# Altium footprint library PcbLib_jp.PcbLib: 255 footprints (part 3 of 16)
Each footprint in its own frame and in the unit in brackets; x right, y up, seen from the top. Pads: shape width x height; smd on the part's side, far side on the other; paste and mask are expansions set on the pad; w line width, h text height; cw(c..) or ccw(c..) is an arc to the next point about the centre after c.
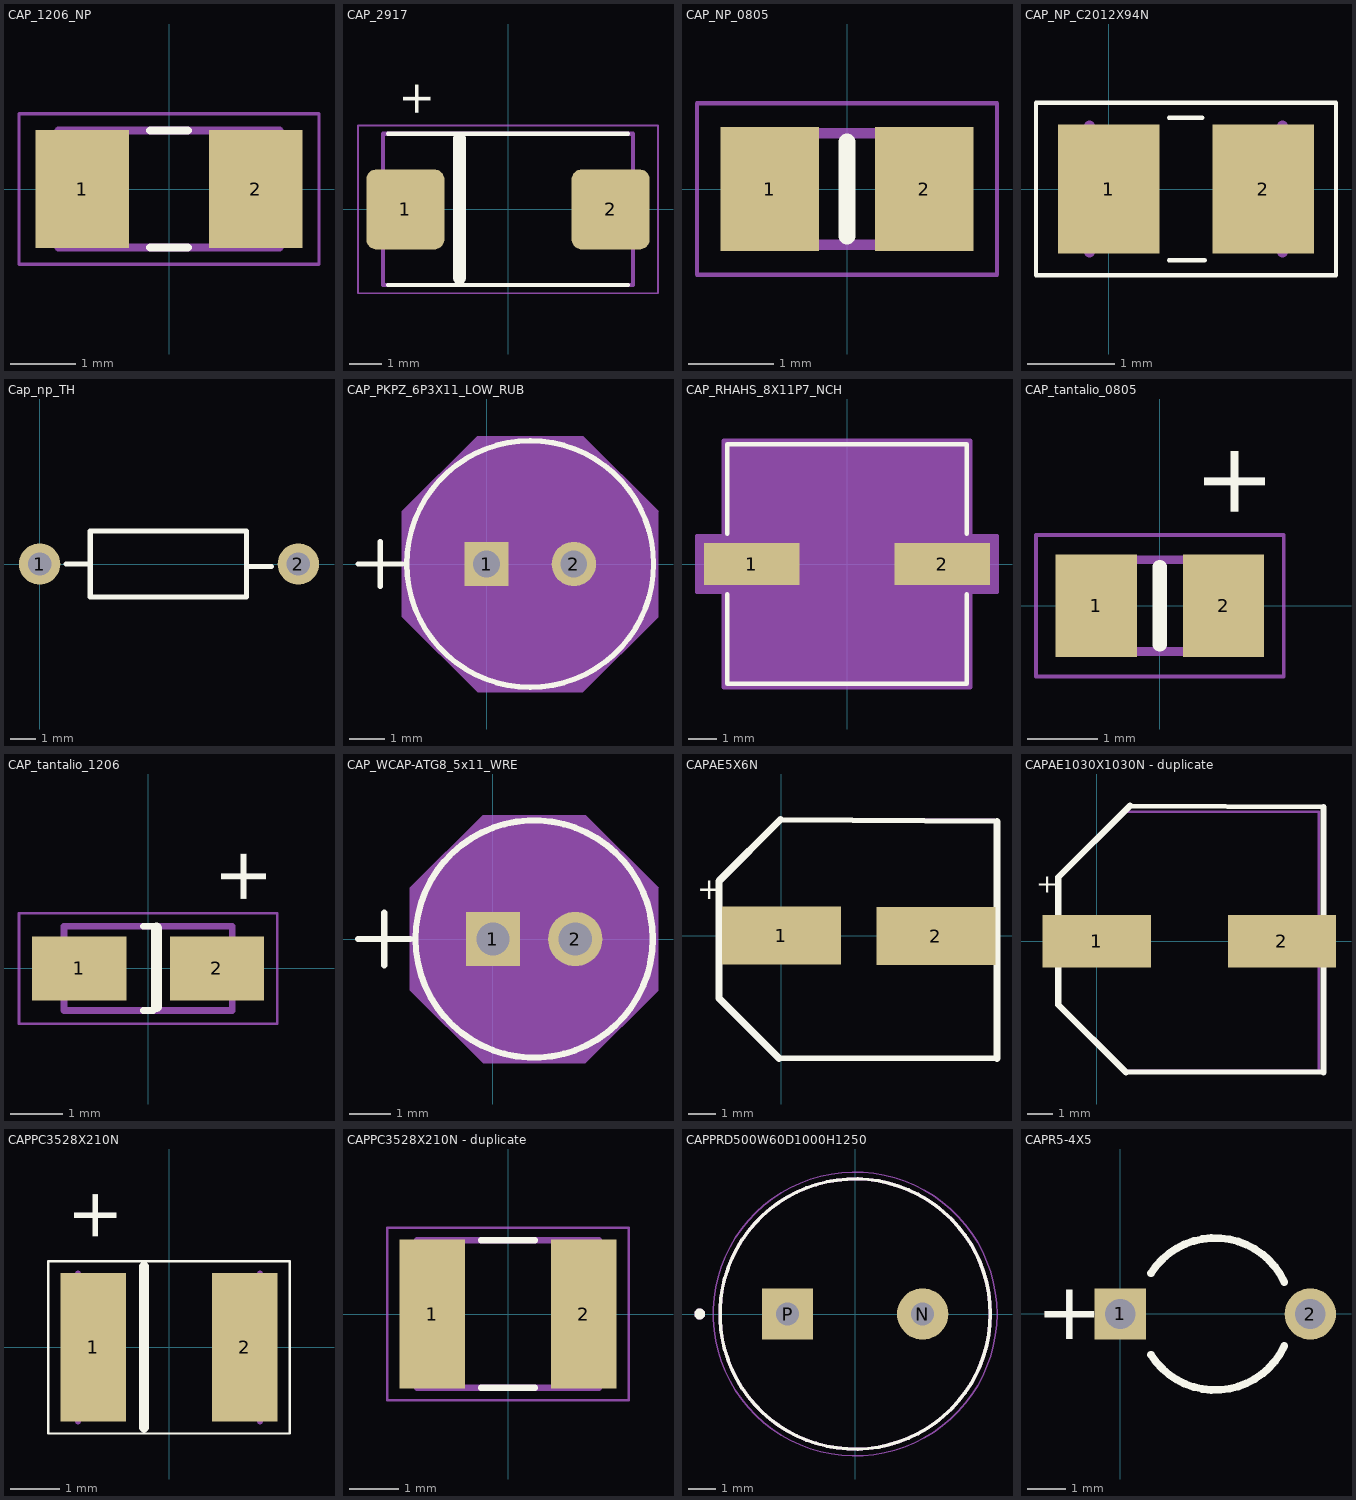
[diagram p2: the footprints below, top view; thin cyan lines are the x and y axes]

## CAP_1206_NP [mm]
pads (2):
  rect 1.44x1.82 smd: 1(-1.336,0) 2(1.336,0)
Top Overlay:
  lines w0.127: -0.29,-0.9 0.29,-0.9 ; -0.29,0.9 0.29,0.9
Mechanical 13:
  lines w0.127: -1.7,-0.9 -1.7,0.9 1.7,0.9 1.7,-0.9 -1.7,-0.9
Mechanical 15:
  lines w0.05: -2.308,-1.158 -2.308,1.158 2.308,1.158 2.308,-1.158 -2.308,-1.158
3D body "User Library-Vhip cap 1206.STEP": height 1.85, standoff 0.15, extent -1.66,-0.87 1.54,0.87

## CAP_2917 [mm]
pads (2):
  rrect25% 2.37x2.43 smd: 1(-3.12,0) 2(3.12,0)
Top Overlay:
  lines w0.127: -3.65,-2.3 3.65,-2.3 ; -3.65,2.3 3.65,2.3
  lines w0.4: -1.47,-2.09 -1.47,2.16
  text "+" at -2.35,2.79 h1
Mechanical 13:
  lines w0.127: -3.8,-2.3 -3.8,2.3 3.8,2.3 3.8,-2.3 -3.8,-2.3
Mechanical 15:
  lines w0.05: -4.56,-2.55 4.56,-2.55 4.56,2.55 -4.56,2.55 -4.56,-2.55
3D body "User Library-AVX_D_CASE.STEP": height 3.01, standoff 0, extent -3.71,-2.285 3.69,2.165

## CAP_NP_0805 [mm]
pads (2):
  rect 1.15x1.45 smd: 1(-0.9,0) 2(0.9,0)
Top Overlay:
  lines w0.2: 0,-0.55 0,0.55
Mechanical 13:
  region: 1,-0.65 0.5,-0.65 0.5,0.65 1,0.65
  region: -0.5,-0.65 -1,-0.65 -1,0.65 -0.5,0.65
  lines w0.127: -1,-0.65 -1,0.65 1,0.65 1,-0.65 -1,-0.65
Mechanical 15:
  lines w0.05: -1.75,-1 -1.75,1 1.75,1 1.75,-1 -1.75,-1
3D body "08055C104MAT2A.step": height 1.04, standoff 0.1, extent -1.045,-0.625 0.965,0.625

## CAP_NP_C2012X94N [mm]
pads (2):
  rect 1.16x1.47 smd: 1(0,0) 2(1.76,0)
Top Overlay:
  lines w0.05: 0.686,-0.813 1.092,-0.813 ; 0.686,0.813 1.067,0.813 ; -0.833,-0.983 2.593,-0.983 2.593,0.983 -0.833,0.983 -0.833,-0.983
Mechanical 13:
  lines w0.127: -0.22,-0.72 -0.22,0.72 -0.22,-0.72 ; 1.98,-0.72 1.98,0.72 1.98,-0.72
3D body "User Library-CapCeramic_Kemet_0603_1608.STEP": height 0.8, standoff 0, extent 0.055,-0.4 1.655,0.4

## Cap_np_TH [mm] "Axial Device, Thru-Hole; 2 Leads; 0.5 in Pin Spacing"
height 2.54
pads (2):
  round 1.6 hole 0.9: 1(0,0) 2(10,0)
Top Overlay:
  lines w0.2: 1.016,0 1.956,0 ; 8.052,-0.102 8.966,-0.102 ; 1.956,-1.27 7.722,-1.27 8.001,-1.27 8.001,1.27 1.956,1.27 1.956,-1.27
3D body "User Library-PB-5R0H104-R.STEP": height 4, standoff -11.02, extent -0.672,-2.972 10.628,3.028

## CAP_PKPZ_6P3X11_LOW_RUB [mil]
pads (2):
  rect 50x50 / inner round 60 / far side round 50 hole 30 paste-25 mask+0: 1(0,0)
  round 50 / inner round 60 / far side round 50 hole 30 paste-25 mask+0: 2(98.43,0)
Top Overlay:
  circle w6: c49.21,0 r139
  lines w6: -144.79,0 -94.79,0 ; -119.79,-25 -119.79,25
Mechanical 13:
  circle w0: c49.21,0 r134
  lines w1: -144.79,0 -94.79,0 ; -119.79,-25 -119.79,25
Mechanical 15:
  region: -94.79,59.29 -10.08,144 108.51,144 193.21,59.29 193.21,-59.29 108.51,-144 -10.08,-144 -94.79,-59.29
  lines w1: -94.79,-59.29 -94.79,59.29 -10.08,144 108.51,144 193.21,59.29 193.21,-59.29 108.51,-144 -10.08,-144 -94.79,-59.29
3D body "CAP_PKPZ_6P3X11_LOW_RUB.step": height 492.6, standoff -160, extent -84.8,-134 184.32,134

## CAP_RHAHS_8X11P7_NCH [mil]
pads (2):
  rect 134x59 smd paste+0 mask+0: 1(-134,0) 2(134,0)
Top Overlay:
  lines w6: -168.5,-42.6 -168.5,-168.5 168.5,-168.5 168.5,-42.6 ; -168.5,42.6 -168.5,168.5 168.5,168.5 168.5,42.6
Mechanical 13:
  lines w1: -163.5,-81.75 -81.75,-163.5 ; -163.5,81.75 -81.75,163.5 ; -163.5,-163.5 -163.5,163.5 163.5,163.5 163.5,-163.5 -163.5,-163.5
Mechanical 15:
  region: -173.5,-39.5 -211,-39.5 -211,39.5 -173.5,39.5 -173.5,173.5 173.5,173.5 173.5,39.5 211,39.5 211,-39.5 173.5,-39.5 173.5,-173.5 -173.5,-173.5
  lines w6: -211,-39.5 -173.5,-39.5 -173.5,-173.5 173.5,-173.5 173.5,-39.5 211,-39.5 211,39.5 173.5,39.5 173.5,173.5 -173.5,173.5 -173.5,39.5 -211,39.5 -211,-39.5
3D body "CAP_RHAHS_8X11P7_NCH.step": height 474.09, standoff 0, extent -180.98,-163.5 180.98,163.5

## CAP_tantalio_0805 [mm]
pads (2):
  rect 1.15x1.45 smd: 1(-0.9,0) 2(0.9,0)
Top Overlay:
  lines w0.2: 0,-0.55 0,0.55
  text "+" at 1.49,1.18 h1
Mechanical 13:
  region: -0.5,-0.65 -1,-0.65 -1,0.65 -0.5,0.65
  region: 1,-0.65 0.5,-0.65 0.5,0.65 1,0.65
  lines w0.127: -1,-0.65 1,-0.65 1,0.65 -1,0.65 -1,-0.65
Mechanical 15:
  lines w0.05: -1.75,-1 1.75,-1 1.75,1 -1.75,1 -1.75,-1
3D body "08055C104MAT2A.step": height 1.22, standoff -0.03, extent -0.995,-0.47 1.015,0.47

## CAP_tantalio_1206 [mm]
pads (2):
  rect 1.79x1.21 smd: 1(-1.31,0) 2(1.31,0)
Top Overlay:
  lines w0.127: -0.095,-0.8 0.095,-0.8 ; -0.095,0.8 0.095,0.8
  lines w0.203: 0.16,-0.73 0.16,0.77
  text "+" at 2.25,1.17 h1
Mechanical 13:
  lines w0.127: -1.6,-0.8 1.6,-0.8 1.6,0.8 -1.6,0.8 -1.6,-0.8
Mechanical 15:
  lines w0.05: -2.455,-1.05 2.455,-1.05 2.455,1.05 -2.455,1.05 -2.455,-1.05
3D body "TPSA225M010R1800.STEP": height 1.8, standoff 0, extent -1.65,-0.81 1.55,0.79

## CAP_WCAP-ATG8_5x11_WRE [mil]
pads (2):
  rect 52x52 / inner round 60 / far side rect 52x52 hole 32 paste-26 mask+0: 1(0,0)
  round 52 / inner round 60 / far side round 52 hole 32 paste-26 mask+0: 2(78.74,0)
Top Overlay:
  circle w6: c39.37,0 r113.5
  lines w6: -129.13,0 -79.13,0 ; -104.13,-25 -104.13,25
Mechanical 13:
  circle w0: c39.37,0 r108.5
  lines w1: -129.13,0 -79.13,0 ; -104.13,-25 -104.13,25
Mechanical 15:
  region: -79.13,48.79 -9.42,118.5 88.16,118.5 157.87,48.79 157.87,-48.79 88.16,-118.5 -9.42,-118.5 -79.13,-48.79
  lines w1: -79.13,-48.79 -79.13,48.79 -9.42,118.5 88.16,118.5 157.87,48.79 157.87,-48.79 88.16,-118.5 -9.42,-118.5 -79.13,-48.79
3D body "CAP_WCAP-ATG8_5x11_WRE.step": height 482.6, standoff -165.98, extent -69.13,-108.5 149.03,108.5

## CAPAE5X6N [mm]
pads (2):
  rect 4.3x2.1 smd: 1(0,0) 2(5.588,-0.013)
Top Overlay:
  lines w0.2: -0.076,-4.432 7.795,-4.432 ; -0.036,4.193 7.795,4.135
  lines w0.254: -0.076,-4.432 -2.245,-2.264 -2.245,1.984 -0.036,4.193 ; 7.795,-4.432 7.795,4.135
  text "+" at -3.048,1.321 h0.76
Mechanical 13:
  lines w0.1: -2.245,-2.264 -2.188,1.984 ; -2.245,1.984 -0.036,4.193 7.689,4.193 ; -2.007,-2.502 -0.051,-4.432 ; -0.172,-4.432 7.795,-4.432 7.795,4.135
3D body "User Library-9D.STEP": height 6.42, standoff 0, extent -0.206,-2.476 5.794,2.823

## CAPAE1030X1030N - duplicate [mm]
pads (2):
  rect 4.3x2.1 smd: 1(0,0) 2(7.366,0)
Top Overlay:
  lines w0.2: 1.165,-5.207 9.017,-5.207 ; 1.323,5.387 9.017,5.33
  lines w0.254: 1.165,-5.207 -1.524,-2.518 -1.524,-2.413 -1.524,2.54 1.323,5.387 ; 9.017,-5.207 9.017,5.33
  text "+" at -2.413,1.93 h0.76
Mechanical 13:
  lines w0.1: -1.467,-2.575 -1.467,2.575 1.108,5.15 8.833,5.15 8.833,-5.15 1.108,-5.15 -1.467,-2.575
3D body: height 10.41, standoff 0, extent -1.639,-4.997 9.361,5.403

## CAPPC3528X210N [mm]
pads (2):
  rect 1.34x3.02 smd: 1(-1.54,0) 2(1.54,0)
Top Overlay:
  lines w0.05: -2.458,-1.75 2.458,-1.75 2.458,1.75 -2.458,1.75 -2.458,-1.75
  lines w0.203: -0.51,-1.63 -0.51,1.65
  text "+" at -1.06,2.11 h1
Mechanical 13:
  lines w0.127: -1.85,-1.5 -1.85,1.5 ; 1.85,-1.5 1.85,1.5
3D body "T491B476K010AT.STEP": height 2.1, standoff 0, extent -1.79,-1.39 1.71,1.41

## CAPPC3528X210N - duplicate [mm]
pads (2):
  rect 1.34x3.02 smd: 1(-1.54,0) 2(1.54,0)
Top Overlay:
  lines w0.127: -0.55,-1.5 0.55,-1.5 ; -0.55,1.5 0.55,1.5
Mechanical 13:
  lines w0.127: -1.85,-1.5 -1.85,1.5 1.85,1.5 1.85,-1.5 -1.85,-1.5
Mechanical 15:
  lines w0.05: -2.458,-1.75 -2.458,1.75 2.458,1.75 2.458,-1.75 -2.458,-1.75
3D body "TAJB107M006RNJ.step": height 2.1, standoff 0, extent -1.75,-1.4 1.75,1.4

## CAPPRD500W60D1000H1250 [mm]
pads (2):
  round 1.9 hole 0.85: N(2.5,0)
  rect 1.9x1.9 hole 0.85: P(-2.5,0)
Top Overlay:
  circle w0.2: c-5.75,0 r0.1
  circle w0.127: c0,0 r5
Mechanical 13:
  circle w0.2: c-5.75,0 r0.1
  circle w0.127: c0,0 r5
Mechanical 15:
  circle w0.05: c0,0 r5.25
3D body "step_temp.STEP": height 12.5, standoff -17, extent -5,-4.998 5,4.998

## CAPR5-4X5 [mm] "Capacitor; 2 Leads"
height 12
pads (2):
  rect 1.35x1.35 hole 0.8: 1(0,0)
  round 1.35 hole 0.8: 2(5,0)
Top Overlay:
  lines w0.2: 0.813,-1.075 ccw(c2.5,0) 4.319,-0.832 ; 0.813,1.075 cw(c2.5,0) 4.319,0.832
  text "+" at -2.21,-0.66 h1.52
3D body: height 2.95, standoff -2.95, extent 2.5,-2.921 5.04,-1.397
3D body "CircuitWorks-ELECTROLITIC CAPACITOR RADIAL 8X12.STEP": height 17, standoff 2.5, extent -0.865,-4.127 7.135,3.873